# Altium footprint library TranDangKhoa-LIB.PcbLib: 1435 footprints (part 62 of 90)
Each footprint in its own frame and in the unit in brackets; x right, y up, seen from the top. Pads: shape width x height; smd on the part's side, far side on the other; paste and mask are expansions set on the pad; w line width, h text height; cw(c..) or ccw(c..) is an arc to the next point about the centre after c.
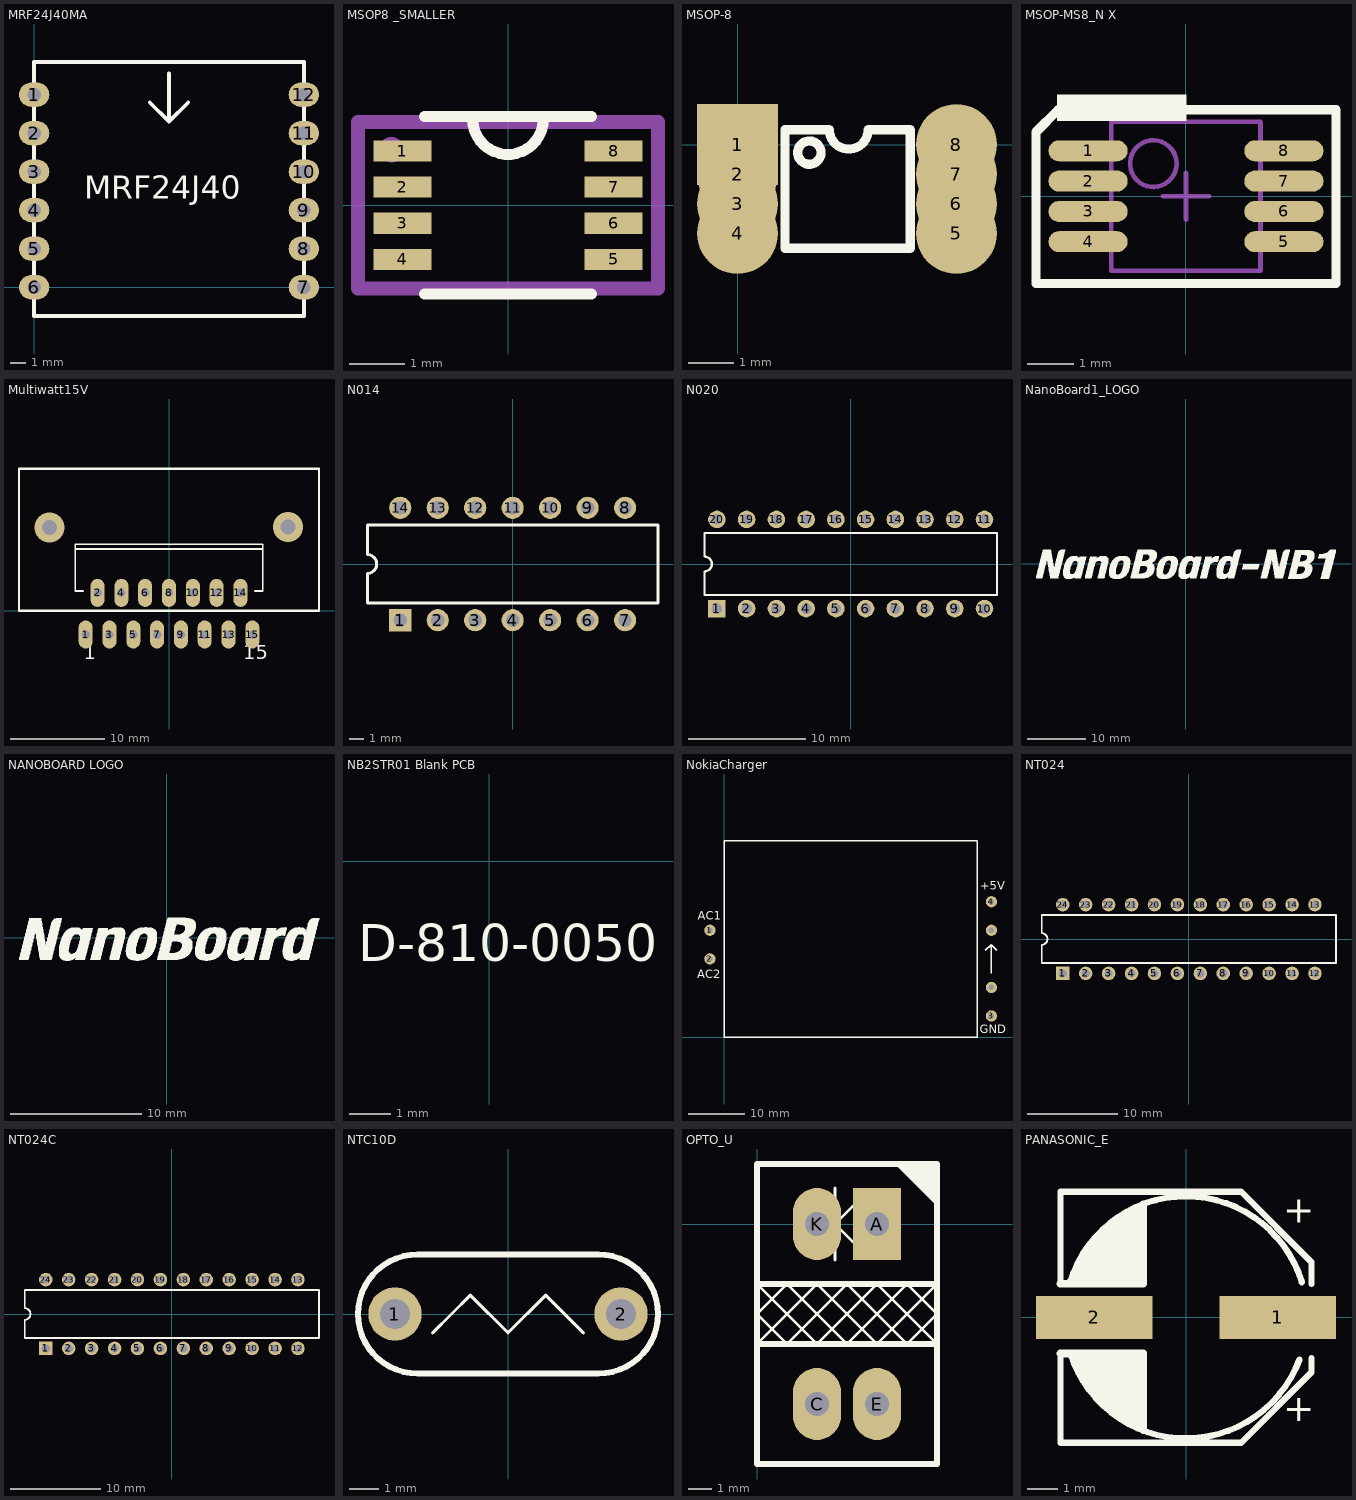
[diagram p61: the footprints below, top view; thin cyan lines are the x and y axes]

## MRF24J40MA [mm] "Microchip Zigbee Module"
pads (12):
  oval 2x1.6 hole 0.9: 1(0,12.7) 2(0,10.16) 3(0,7.62) 4(0,5.08) 5(0,2.54) 6(0,0) 7(17.78,0) 8(17.78,2.54) 9(17.78,5.08) 10(17.78,7.62) 11(17.78,10.16) 12(17.78,12.7)
Top Overlay:
  lines w0.254: 0,8.255 0,-1.905 ; 7.62,12.192 8.89,10.922 ; 8.89,14.097 8.89,10.922 ; 10.16,12.192 8.89,10.922 ; 0,-1.905 0,14.859 17.78,14.859 17.78,-1.905 0,-1.905
  text "MRF24J40" at 3.302,5.842 h1.52

## MSOP8 _SMALLER [mm]
pads (8):
  rect 1.04x0.38 smd mask+0.076: 1(-1.9,0.975) 2(-1.9,0.325) 3(-1.9,-0.325) 4(-1.9,-0.975) 5(1.9,-0.975) 6(1.9,-0.325) 7(1.9,0.325) 8(1.9,0.975)
Top Overlay:
  lines w0.2: -1.5,-1.6 1.5,-1.6 ; -1.5,1.6 1.5,1.6 ; -0.635,1.549 ccw(c0,1.549) 0.635,1.549
Mechanical 16:
  circle w0.254: c-2.1,1 r0.1
  lines w0.254: -2.7,-1.5 2.7,-1.5 2.7,1.5 -2.7,1.5 -2.7,-1.5
Mechanical 29:
  text ".Designator" at 1,0.4 h1
3D body: height 0.9, standoff 0, extent -1.5,-1.6 1.5,1.6

## MSOP-8 [mil]
pads (8):
  rect 70x70 smd: 1(0,0)
  round 70 smd: 2(0,-25.59) 3(0,-51.18) 4(0,-76.77) 5(188.98,-76.77) 6(188.98,-51.18) 7(188.98,-25.59) 8(188.98,0)
Top Overlay:
  circle w7.87: c62,-7 r10.05
  lines w7.87: 79.2,12.8 ccw(c96,12.8) 112.8,12.8
  lines w8: 79.2,12.8 41,12.8 41,-89.57 149,-89.57 149,12.8 112.8,12.8

## MSOP-MS8_N X [mm] "TSOP, 8-Leads, Body 3x3mm, Pitch 0.65mm, IPC Medium Density"
height 1.1
pads (8):
  oval 1.7x0.45 smd: 1(-2.1,0.975) 2(-2.1,0.325) 3(-2.1,-0.325) 4(-2.1,-0.975) 5(2.1,-0.975) 6(2.1,-0.325) 7(2.1,0.325) 8(2.1,0.975)
Top Overlay:
  rectangle: -2.768,1.61 0.01,2.184
  lines w0.2: -3.216,-1.872 3.217,-1.872 3.217,1.855 -2.738,1.855 -3.216,1.378 -3.216,-1.872
Mechanical 13:
  circle w0.1: c-0.7,0.7 r0.5
  lines w0.1: -1.6,-1.6 1.6,-1.6 1.6,1.6 -1.6,1.6 -1.6,-1.6
Mechanical 15:
  lines w0.1: -0.5,0 0.5,0 ; 0,-0.5 0,0.5 ; -3.2,-1.85 3.2,-1.85 3.2,1.85 -2.744,1.85 -3.2,1.394 -3.2,-1.85
3D body: height 1.1, standoff 0, extent -1.6,-1.6 1.6,1.6

## Multiwatt15V [mm] "TO, Thru-Hole, Vertical, Heatsink Mounted; 15 Bent Staggered Leads; Pitch 1.27 mm"
height 21
pads (15):
  oval 1.5x3 hole 0.9: 1(-8.89,-2.54) 2(-7.62,1.905) 3(-6.35,-2.54) 4(-5.08,1.905) 5(-3.81,-2.54) 6(-2.54,1.905) 7(-1.27,-2.54) 8(0,1.905) 9(1.27,-2.54) 10(2.54,1.905) 11(3.81,-2.54) 12(5.08,1.905) 13(6.35,-2.54) 14(7.62,1.905) 15(8.89,-2.54)
via 12.687,8.928 diameter 3.2 hole 1.6
via -12.763,8.903 diameter 3.2 hole 1.6
Top Overlay:
  lines w0.2: -10,6.59 10,6.59 ; -9.144,2.09 -10,2.09 -10,7.09 10,7.09 10,2.09 9.144,2.09
  lines w0.254: -16,0 16,0 16,15.136 -16,15.136 -16,0
  text "1" at -9.12,-5.165 h1.5
  text "15" at 7.94,-5.165 h1.5
3D body "User Library-MULTIWAT T15.step": height 22.74, standoff -2.18, extent -9.8,-2.815 9.8,6.253

## N014 [mm] "DIP; 14 Leads; Row Spacing 7.62 mm; Pitch 2.54 mm"
height 5.08
pads (14):
  rect 1.5x1.5 hole 0.9: 1(-7.62,-3.81)
  round 1.5 hole 0.9: 2(-5.08,-3.81) 3(-2.54,-3.81) 4(0,-3.81) 5(2.54,-3.81) 6(5.08,-3.81) 7(7.62,-3.81) 8(7.62,3.81) 9(5.08,3.81) 10(2.54,3.81) 11(0,3.81) 12(-2.54,3.81) 13(-5.08,3.81) 14(-7.62,3.81)
Top Overlay:
  lines w0.2: -9.85,-2.65 9.85,-2.65 9.85,2.65 -9.85,2.65 -9.85,0.635 cw(c-9.85,0) -9.85,-0.635 -9.85,-2.65

## N020 [mm] "DIP; 20 Leads; Row Spacing 7.62 mm; Pitch 2.54 mm"
height 5.08
pads (20):
  rect 1.5x1.5 hole 0.9: 1(-11.43,-3.81)
  round 1.5 hole 0.9: 2(-8.89,-3.81) 3(-6.35,-3.81) 4(-3.81,-3.81) 5(-1.27,-3.81) 6(1.27,-3.81) 7(3.81,-3.81) 8(6.35,-3.81) 9(8.89,-3.81) 10(11.43,-3.81) 11(11.43,3.81) 12(8.89,3.81) 13(6.35,3.81) 14(3.81,3.81) 15(1.27,3.81) 16(-1.27,3.81) 17(-3.81,3.81) 18(-6.35,3.81) 19(-8.89,3.81) 20(-11.43,3.81)
Top Overlay:
  lines w0.2: -12.5,-2.65 12.5,-2.65 12.5,2.65 -12.5,2.65 -12.5,0.635 cw(c-12.5,0) -12.5,-0.635 -12.5,-2.65

## NanoBoard1_LOGO [mm] "NanoBoard 1 Logo"
height 12.3
Top Overlay:
  drawing of 3535 lines, arcs and shapes, not listed

## NANOBOARD LOGO [mm]
Top Overlay:
  drawing of 1643 lines, arcs and shapes, not listed

## NB2STR01 Blank PCB [mm]
Top Overlay:
  text "D-810-0050" at -3.175,-2.413 h0.89

## NokiaCharger [mm]
pads (6):
  round 2 hole 1: 1(-2.54,19.05) 2(-2.54,13.97) 3(47.54,3.81) 4(47.54,24.13) TEMP(47.54,8.89) TEMP(47.54,19.05)
Top Overlay:
  lines w0.254: 46.482,15.494 47.498,16.51 ; 47.498,11.43 47.498,16.51 ; 48.514,15.494 47.498,16.51 ; 0,0 45,0 ; 0,0 45,0 ; 0,0 0,35 ; 0,35 45,35 ; 0,35 45,35 ; 45,0 45,35
  text "AC2" at -4.826,10.541 h1.52
  text "AC1" at -4.699,20.955 h1.52
  text "+5V" at 45.593,26.289 h1.52
  text "GND" at 45.466,0.762 h1.52

## NT024 [mm] "DIP; 24 Leads; Row Spacing 7.62 mm; Pitch 2.54 mm"
height 5.08
pads (24):
  rect 1.5x1.5 hole 0.9: 1(-13.97,-3.81)
  round 1.5 hole 0.9: 2(-11.43,-3.81) 3(-8.89,-3.81) 4(-6.35,-3.81) 5(-3.81,-3.81) 6(-1.27,-3.81) 7(1.27,-3.81) 8(3.81,-3.81) 9(6.35,-3.81) 10(8.89,-3.81) 11(11.43,-3.81) 12(13.97,-3.81) 13(13.97,3.81) 14(11.43,3.81) 15(8.89,3.81) 16(6.35,3.81) 17(3.81,3.81) 18(1.27,3.81) 19(-1.27,3.81) 20(-3.81,3.81) 21(-6.35,3.81) 22(-8.89,3.81) 23(-11.43,3.81) 24(-13.97,3.81)
Top Overlay:
  lines w0.2: -16.3,-2.65 16.3,-2.65 16.3,2.65 -16.3,2.65 -16.3,0.635 cw(c-16.3,0) -16.3,-0.635 -16.3,-2.65

## NT024C [mm] "DIP; 24 Leads; Row Spacing 7.62 mm; Pitch 2.54 mm"
height 5.08
pads (24):
  rect 1.5x1.5 hole 0.9: 1(-13.97,-3.81)
  round 1.5 hole 0.9: 2(-11.43,-3.81) 3(-8.89,-3.81) 4(-6.35,-3.81) 5(-3.81,-3.81) 6(-1.27,-3.81) 7(1.27,-3.81) 8(3.81,-3.81) 9(6.35,-3.81) 10(8.89,-3.81) 11(11.43,-3.81) 12(13.97,-3.81) 13(13.97,3.81) 14(11.43,3.81) 15(8.89,3.81) 16(6.35,3.81) 17(3.81,3.81) 18(1.27,3.81) 19(-1.27,3.81) 20(-3.81,3.81) 21(-6.35,3.81) 22(-8.89,3.81) 23(-11.43,3.81) 24(-13.97,3.81)
Top Overlay:
  lines w0.2: -16.3,-2.65 -16.3,-0.635 ccw(c-16.3,0) -16.3,0.635 -16.3,2.65 16.3,2.65 16.3,-2.65 -16.3,-2.65

## NTC10D [mm] "Capacitor, Ceramic, ThrNTC 2A"
height 5
pads (2):
  round 1.8 hole 1: 1(-3.81,0) 2(3.81,0)
Top Overlay:
  lines w0.1: -2.54,-0.635 -1.905,0 -1.27,0.635 0,-0.635 1.27,0.635 ; 1.27,0.635 2.54,-0.635 1.27,0.635
  lines w0.2: -3.048,-2.008 cw(c-3.048,0) -3.048,2.008 3.048,2.008 cw(c3.048,0) 3.048,-2.008 -3.048,-2.008

## OPTO_U [mil] "Opto hinh chu U"
height 104.33
pads (4):
  rect 80x120 hole 40: A(200,0)
  oval 80x120 hole 40: C(100,-300) E(200,-300) K(100,0)
Top Overlay:
  region: 297.5,97.5 232.5,97.5 297.5,32.5
  lines w5: 0,-200 50,-150 100,-100 200,-200 230,-170 300,-100 300,-200 200,-100 100,-200 90,-190 60,-160 0,-100 ; 130,-60 130,60 ; 180,-50 180,50 ; 180,-50 180,50 ; 180,-50 130,0 180,50 ; 0,-150 30,-180 50,-200 150,-100 250,-200 300,-150 250,-100 150,-200 50,-100 0,-150
  lines w10: 0,-200 300,-200 ; 0,-150 0,-110 ; 0,-100 300,-100 ; 300,-150 300,-140 ; 0,-400 300,-400 300,100 0,100 0,-400
3D body "SW3dPS-optek opb620.STEP": height 374.02, standoff -100, extent 43.46,-346.85 260,46.85

## PANASONIC_E [mm] "PANASONIC_E"
pads (2):
  rect 3.8x1.4 smd: 1(3,0) 2(-3,0)
Top Overlay:
  lines w0.102: -4.1,-4.1 1.8,-4.1 4.1,-1.8 ; -4.1,4.1 1.8,4.1 4.1,1.8
  lines w0.203: -4.1,-1.177 -4.1,-4.1 1.8,-4.1 4.1,-1.8 4.1,-1.334 ; -4.1,1.097 -4.1,4.1 1.8,4.1 4.1,1.8 4.1,1.097 ; -3.782,1.152 cw(c0,0) 3.784,1.147 ; -3.774,-1.177 ccw(c0,0) 3.706,-1.379
  lines w0.254: -4.1,-1.177 -2.2,-1.177 ; -4.1,1.097 -2.169,1.097 ; -3.613,1.27 -3.429,1.097 ; -3.613,1.397 -3.782,1.152 -3.175,2.032 ; -2.169,3.251 -2.169,1.097 ; -1.397,-3.683 -1.397,-1.177 ; -1.397,1.097 -2.413,1.097 ; -1.397,3.683 -1.397,1.152 -1.651,1.097 ; -3.429,1.097 -3.429,1.905 -3.175,2.032 ; -3.429,1.097 -3.175,1.097 -3.175,2.032 ; -3.302,-1.905 -3.774,-1.177 -3.429,-1.177 -3.302,-1.905 ; -3.302,-1.905 -2.921,-2.54 ; -3.175,2.032 -3.048,2.286 -2.667,2.808 ; -2.921,-2.54 -3.175,-2.159 -3.175,-1.177 -2.921,-1.177 -2.921,-2.54 ; -2.921,-2.54 -2.413,-2.921 ; -2.667,2.808 -2.921,2.54 -2.921,1.097 -2.667,1.097 -2.667,2.808 ; -2.667,2.808 -2.413,3.048 -2.413,1.097 ; -2.413,-2.921 -2.667,-2.794 -2.667,-1.177 -2.413,-1.177 ; -2.413,-2.921 -2.413,-1.177 ; -2.413,-2.921 -2.2,-3.25 ; -2.413,-1.177 -1.397,-1.177 ; -2.413,1.097 -2.169,1.097 ; -2.2,-3.25 -1.905,-3.175 -2.032,-2.921 -2.2,-1.177 ; -2.2,-3.25 -2.032,-1.651 -1.905,-1.334 ; -2.2,-3.25 -2.2,-1.177 ; -2.2,-3.25 -2.2,-1.177 ; -2.2,-1.177 -1.905,-1.334 ; -2.2,-1.177 -1.651,-1.177 ; -2.169,1.097 -1.905,3.429 ; -2.169,1.097 -1.651,1.097 ; -1.905,-1.334 -1.651,-1.177 ; -1.905,-1.334 -1.905,-3.429 -1.651,-3.556 -1.651,-1.177 ; -1.905,3.429 -1.905,1.27 -1.651,1.097 ; -1.905,3.429 -1.651,3.556 -1.651,1.097 ; -1.651,-1.177 -1.397,-1.177
  text "+" at 3.175,2.794 h1.52
  text "+" at 3.175,-3.683 h1.52
3D body "ALU-E.STEP": height 6.2, standoff 0, extent -4.445,-4.191 4.555,4.109